# Altium footprint library connectors_socets.pcblib: 567 footprints (part 3 of 36)
Each footprint in its own frame and in the unit in brackets; x right, y up, seen from the top. Pads: shape width x height; smd on the part's side, far side on the other; paste and mask are expansions set on the pad; w line width, h text height; cw(c..) or ccw(c..) is an arc to the next point about the centre after c.
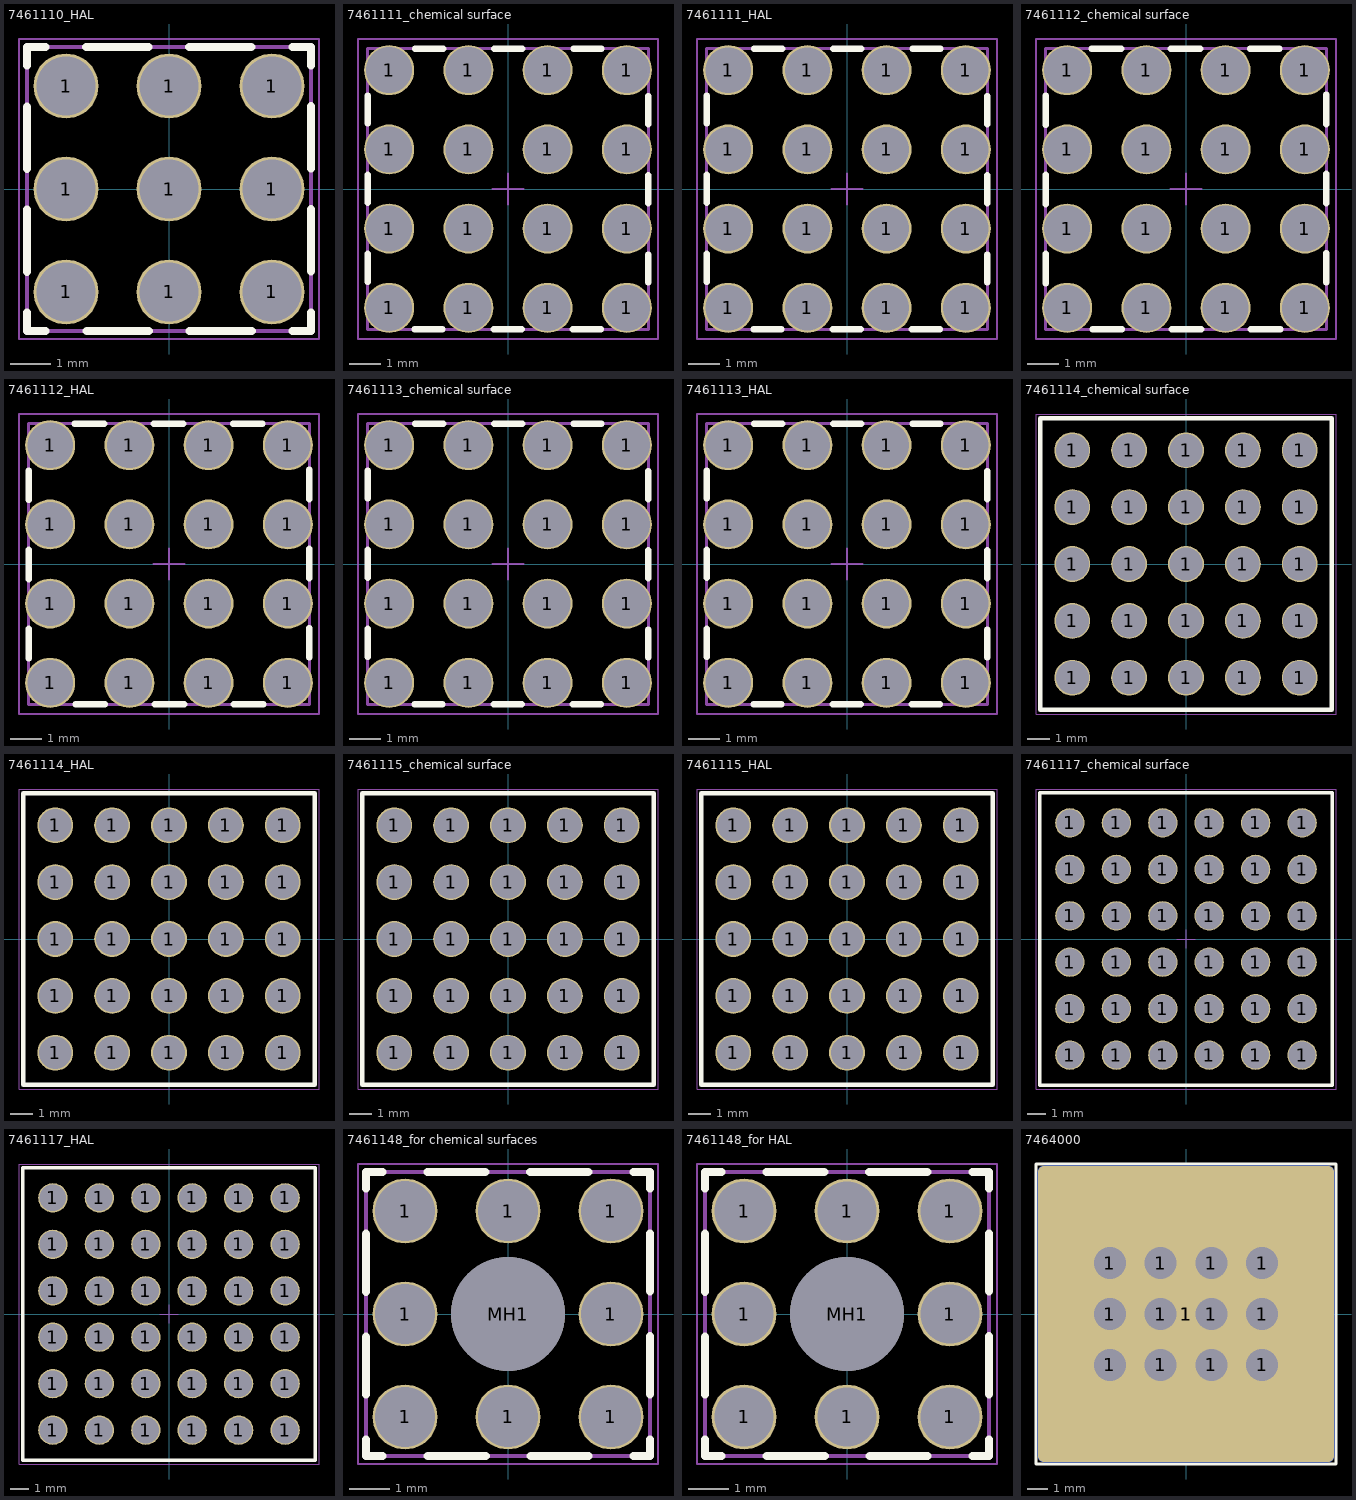
[diagram p2: the footprints below, top view; thin cyan lines are the x and y axes]

## 7461110_HAL [mm] "ID3.2mm, thrh 4mm"
height 14
pads (9):
  round 1.6 hole 1.45: 1(-2.54,-2.54) 1(-2.54,0) 1(-2.54,2.54) 1(0,-2.54) 1(0,0) 1(0,2.54) 1(2.54,-2.54) 1(2.54,0) 1(2.54,2.54)
Top Overlay:
  lines w0.2: -3.5,-3.05 -3.5,-3.5 -3.05,-3.5 ; -3.5,-2.04 -3.5,-0.51 ; -3.5,0.5 -3.5,2.03 ; -3.5,3.05 -3.5,3.5 -3.05,3.5 ; -2.04,3.5 -0.51,3.5 ; -2.03,-3.5 -0.5,-3.5 ; 0.5,3.5 2.03,3.5 ; 0.51,-3.5 2.04,-3.5 ; 3.05,-3.5 3.5,-3.5 3.5,-3.05 ; 3.05,3.5 3.5,3.5 3.5,3.05 ; 3.5,-2.03 3.5,-0.5 ; 3.5,0.51 3.5,2.04
Mechanical 11:
  lines w0.1: -3.5,-3.5 -3.5,3.5 3.5,3.5 3.5,-3.5 -3.5,-3.5
  text ".Designator" at -1.75,-0.75 h1.5
Plata3D:
  lines w0.1: -3.5,-3.5 3.5,-3.5 3.5,3.5 -3.5,3.5 -3.5,-3.5
Board3D:
  lines w0.05: -0.5,0 0.5,0 ; 0,-0.5 0,0.5 ; -3.7,-3.7 3.7,-3.7 3.7,3.7 -3.7,3.7 -3.7,-3.7
3D body "7461110.stp": height 14, standoff -3.5, extent -3.5,-3.5 3.5,3.5

## 7461111_chemical surface [mm] "M4, thr 5mm"
height 14
pads (16):
  round 1.6 hole 1.475: 1(-3.81,-3.81) 1(-3.81,-1.27) 1(-3.81,1.27) 1(-3.81,3.81) 1(-1.27,-3.81) 1(-1.27,-1.27) 1(-1.27,1.27) 1(-1.27,3.81) 1(1.27,-3.81) 1(1.27,-1.27) 1(1.27,1.27) 1(1.27,3.81) 1(3.81,-3.81) 1(3.81,-1.27) 1(3.81,1.27) 1(3.81,3.81)
Top Overlay:
  lines w0.2: -4.5,-2.98 -4.5,-2.08 ; -4.5,-0.44 -4.5,0.46 ; -4.5,2.1 -4.5,3 ; -3,-4.5 -2.1,-4.5 ; -2.98,4.5 -2.08,4.5 ; -0.46,-4.5 0.44,-4.5 ; -0.44,4.5 0.46,4.5 ; 2.08,-4.5 2.98,-4.5 ; 2.1,4.5 3,4.5 ; 4.5,-3 4.5,-2.1 ; 4.5,-0.46 4.5,0.44 ; 4.5,2.08 4.5,2.98
Mechanical 11:
  lines w0.1: -4.5,-4.5 -4.5,4.5 4.5,4.5 4.5,-4.5 -4.5,-4.5
  text ".Designator" at -1.75,-0.75 h1.5
Plata3D:
  lines w0.1: -4.5,-4.5 4.5,-4.5 4.5,4.5 -4.5,4.5 -4.5,-4.5
Board3D:
  lines w0.05: -0.5,0 0.5,0 ; 0,-0.5 0,0.5 ; -4.81,-4.81 4.81,-4.81 4.81,4.81 -4.81,4.81 -4.81,-4.81
3D body "7461111.stp": height 14, standoff -3.5, extent -4.5,-4.5 4.5,4.5

## 7461111_HAL [mm] "M4, thr 5mm"
height 14
pads (16):
  round 1.6 hole 1.45: 1(-3.81,-3.81) 1(-3.81,-1.27) 1(-3.81,1.27) 1(-3.81,3.81) 1(-1.27,-3.81) 1(-1.27,-1.27) 1(-1.27,1.27) 1(-1.27,3.81) 1(1.27,-3.81) 1(1.27,-1.27) 1(1.27,1.27) 1(1.27,3.81) 1(3.81,-3.81) 1(3.81,-1.27) 1(3.81,1.27) 1(3.81,3.81)
Top Overlay:
  lines w0.2: -4.5,-2.98 -4.5,-2.08 ; -4.5,-0.44 -4.5,0.46 ; -4.5,2.1 -4.5,3 ; -3,-4.5 -2.1,-4.5 ; -2.98,4.5 -2.08,4.5 ; -0.46,-4.5 0.44,-4.5 ; -0.44,4.5 0.46,4.5 ; 2.08,-4.5 2.98,-4.5 ; 2.1,4.5 3,4.5 ; 4.5,-3 4.5,-2.1 ; 4.5,-0.46 4.5,0.44 ; 4.5,2.08 4.5,2.98
Mechanical 11:
  lines w0.1: -4.5,-4.5 -4.5,4.5 4.5,4.5 4.5,-4.5 -4.5,-4.5
  text ".Designator" at -1.75,-0.75 h1.5
Plata3D:
  lines w0.1: -4.5,-4.5 -4.5,4.5 4.5,4.5 4.5,-4.5 -4.5,-4.5
Board3D:
  lines w0.05: -0.5,0 0.5,0 ; 0,-0.5 0,0.5 ; -4.81,-4.81 4.81,-4.81 4.81,4.81 -4.81,4.81 -4.81,-4.81
3D body "7461111.stp": height 14, standoff -3.5, extent -4.5,-4.5 4.5,4.5

## 7461112_chemical surface [mm] "M5, thr 5mm"
height 14
pads (16):
  round 1.6 hole 1.475: 1(-3.81,-3.81) 1(-3.81,-1.27) 1(-3.81,1.27) 1(-3.81,3.81) 1(-1.27,-3.81) 1(-1.27,-1.27) 1(-1.27,1.27) 1(-1.27,3.81) 1(1.27,-3.81) 1(1.27,-1.27) 1(1.27,1.27) 1(1.27,3.81) 1(3.81,-3.81) 1(3.81,-1.27) 1(3.81,1.27) 1(3.81,3.81)
Top Overlay:
  lines w0.2: -4.5,-3.03 -4.5,-2.08 ; -4.5,-0.49 -4.5,0.46 ; -4.5,2.05 -4.5,3 ; -3.03,4.5 -2.08,4.5 ; -3,-4.5 -2.05,-4.5 ; -0.49,4.5 0.46,4.5 ; -0.46,-4.5 0.49,-4.5 ; 2.05,4.5 3,4.5 ; 2.08,-4.5 3.03,-4.5 ; 4.5,-3 4.5,-2.05 ; 4.5,-0.46 4.5,0.49 ; 4.5,2.08 4.5,3.03
Mechanical 11:
  lines w0.1: -4.5,-4.5 4.5,-4.5 4.5,4.5 -4.5,4.5 -4.5,-4.5
  text ".Designator" at -1.75,-0.75 h1.5
Plata3D:
  lines w0.1: -4.5,-4.5 -4.5,4.5 4.5,4.5 4.5,-4.5 -4.5,-4.5
Board3D:
  lines w0.05: -0.5,0 0.5,0 ; 0,-0.5 0,0.5 ; -4.81,-4.81 4.81,-4.81 4.81,4.81 -4.81,4.81 -4.81,-4.81
3D body "7461112.stp": height 14, standoff -3.5, extent -4.5,-4.5 4.5,4.5

## 7461112_HAL [mm] "M5, thr 5mm"
height 14
pads (16):
  round 1.6 hole 1.45: 1(-3.81,-3.81) 1(-3.81,-1.27) 1(-3.81,1.27) 1(-3.81,3.81) 1(-1.27,-3.81) 1(-1.27,-1.27) 1(-1.27,1.27) 1(-1.27,3.81) 1(1.27,-3.81) 1(1.27,-1.27) 1(1.27,1.27) 1(1.27,3.81) 1(3.81,-3.81) 1(3.81,-1.27) 1(3.81,1.27) 1(3.81,3.81)
Top Overlay:
  lines w0.2: -4.5,-3.03 -4.5,-2.08 ; -4.5,-0.49 -4.5,0.46 ; -4.5,2.05 -4.5,3 ; -3.03,4.5 -2.08,4.5 ; -3,-4.5 -2.05,-4.5 ; -0.49,4.5 0.46,4.5 ; -0.46,-4.5 0.49,-4.5 ; 2.05,4.5 3,4.5 ; 2.08,-4.5 3.03,-4.5 ; 4.5,-3 4.5,-2.05 ; 4.5,-0.46 4.5,0.49 ; 4.5,2.08 4.5,3.03
Mechanical 11:
  lines w0.1: -4.5,-4.5 -4.5,4.5 4.5,4.5 4.5,-4.5 -4.5,-4.5
  text ".Designator" at -1.75,-0.75 h1.5
Plata3D:
  lines w0.1: -4.5,-4.5 -4.5,4.5 4.5,4.5 4.5,-4.5 -4.5,-4.5
Board3D:
  lines w0.05: -0.5,0 0.5,0 ; 0,-0.5 0,0.5 ; -4.81,-4.81 -4.81,4.81 4.81,4.81 4.81,-4.81 -4.81,-4.81
3D body "7461112.stp": height 14, standoff -3.5, extent -4.5,-4.5 4.5,4.5

## 7461113_chemical surface [mm] "ID5.2mm, thrh 5mm"
height 14
pads (16):
  round 1.6 hole 1.475: 1(-3.81,-3.81) 1(-3.81,-1.27) 1(-3.81,1.27) 1(-3.81,3.81) 1(-1.27,-3.81) 1(-1.27,-1.27) 1(-1.27,1.27) 1(-1.27,3.81) 1(1.27,-3.81) 1(1.27,-1.27) 1(1.27,1.27) 1(1.27,3.81) 1(3.81,-3.81) 1(3.81,-1.27) 1(3.81,1.27) 1(3.81,3.81)
Top Overlay:
  lines w0.2: -4.5,-2.98 -4.5,-2.08 ; -4.5,-0.44 -4.5,0.46 ; -4.5,2.1 -4.5,3 ; -3,-4.5 -2.1,-4.5 ; -2.98,4.5 -2.08,4.5 ; -0.46,-4.5 0.44,-4.5 ; -0.44,4.5 0.46,4.5 ; 2.08,-4.5 2.98,-4.5 ; 2.1,4.5 3,4.5 ; 4.5,-3 4.5,-2.1 ; 4.5,-0.46 4.5,0.44 ; 4.5,2.08 4.5,2.98
Mechanical 11:
  lines w0.1: -4.5,-4.5 -4.5,4.5 4.5,4.5 4.5,-4.5 -4.5,-4.5
  text ".Designator" at -1.75,-0.75 h1.5
Plata3D:
  lines w0.1: -4.5,-4.5 4.5,-4.5 4.5,4.5 -4.5,4.5 -4.5,-4.5
Board3D:
  lines w0.05: -0.5,0 0.5,0 ; 0,-0.5 0,0.5 ; -4.81,-4.81 -4.81,4.81 4.81,4.81 4.81,-4.81 -4.81,-4.81
3D body "7461113.stp": height 14, standoff -3.5, extent -4.5,-4.5 4.5,4.5

## 7461113_HAL [mm] "ID5.2mm, thrh 5mm"
height 14
pads (16):
  round 1.6 hole 1.45: 1(-3.81,-3.81) 1(-3.81,-1.27) 1(-3.81,1.27) 1(-3.81,3.81) 1(-1.27,-3.81) 1(-1.27,-1.27) 1(-1.27,1.27) 1(-1.27,3.81) 1(1.27,-3.81) 1(1.27,-1.27) 1(1.27,1.27) 1(1.27,3.81) 1(3.81,-3.81) 1(3.81,-1.27) 1(3.81,1.27) 1(3.81,3.81)
Top Overlay:
  lines w0.2: -4.5,-2.98 -4.5,-2.08 ; -4.5,-0.44 -4.5,0.46 ; -4.5,2.1 -4.5,3 ; -3,-4.5 -2.1,-4.5 ; -2.98,4.5 -2.08,4.5 ; -0.46,-4.5 0.44,-4.5 ; -0.44,4.5 0.46,4.5 ; 2.08,-4.5 2.98,-4.5 ; 2.1,4.5 3,4.5 ; 4.5,-3 4.5,-2.1 ; 4.5,-0.46 4.5,0.44 ; 4.5,2.08 4.5,2.98
Mechanical 11:
  lines w0.1: -4.5,-4.5 -4.5,4.5 4.5,4.5 4.5,-4.5 -4.5,-4.5
  text ".Designator" at -1.75,-0.75 h1.5
Plata3D:
  lines w0.1: -4.5,-4.5 4.5,-4.5 4.5,4.5 -4.5,4.5 -4.5,-4.5
Board3D:
  lines w0.05: -0.5,0 0.5,0 ; 0,-0.5 0,0.5 ; -4.81,-4.81 4.81,-4.81 4.81,4.81 -4.81,4.81 -4.81,-4.81
3D body "7461113.stp": height 14, standoff -3.5, extent -4.5,-4.5 4.5,4.5

## 7461114_chemical surface [mm] "M6, thr 8mm"
height 20
pads (25):
  round 1.6 hole 1.475: 1(-5.08,-5.08) 1(-5.08,-2.54) 1(-5.08,0) 1(-5.08,2.54) 1(-5.08,5.08) 1(-2.54,-5.08) 1(-2.54,-2.54) 1(-2.54,0) 1(-2.54,2.54) 1(-2.54,5.08) 1(0,-5.08) 1(0,-2.54) 1(0,0) 1(0,2.54) 1(0,5.08) 1(2.54,-5.08) 1(2.54,-2.54) 1(2.54,0) 1(2.54,2.54) 1(2.54,5.08) 1(5.08,-5.08) 1(5.08,-2.54) 1(5.08,0) 1(5.08,2.54) 1(5.08,5.08)
Top Overlay:
  lines w0.2: -6.5,-6.5 -6.5,6.5 6.5,6.5 6.5,-6.5 -6.5,-6.5
Mechanical 11:
  lines w0.1: -6.5,-6.5 6.5,-6.5 6.5,6.5 -6.5,6.5 -6.5,-6.5
  text ".Designator" at -1.75,-0.75 h1.5
Plata3D:
  lines w0.1: -6.5,-6.5 -6.5,6.5 6.5,6.5 6.5,-6.5 -6.5,-6.5
Board3D:
  lines w0.05: -0.5,0 0.5,0 ; 0,-0.5 0,0.5 ; -6.7,-6.7 -6.7,6.7 6.7,6.7 6.7,-6.7 -6.7,-6.7
3D body "7461114.stp": height 20, standoff -3.5, extent -6.5,-6.5 6.5,6.5

## 7461114_HAL [mm] "M6, thr 8mm"
height 20
pads (25):
  round 1.6 hole 1.45: 1(-5.08,-5.08) 1(-5.08,-2.54) 1(-5.08,0) 1(-5.08,2.54) 1(-5.08,5.08) 1(-2.54,-5.08) 1(-2.54,-2.54) 1(-2.54,0) 1(-2.54,2.54) 1(-2.54,5.08) 1(0,-5.08) 1(0,-2.54) 1(0,0) 1(0,2.54) 1(0,5.08) 1(2.54,-5.08) 1(2.54,-2.54) 1(2.54,0) 1(2.54,2.54) 1(2.54,5.08) 1(5.08,-5.08) 1(5.08,-2.54) 1(5.08,0) 1(5.08,2.54) 1(5.08,5.08)
Top Overlay:
  lines w0.2: -6.5,-6.5 6.5,-6.5 6.5,6.5 -6.5,6.5 -6.5,-6.5
Mechanical 11:
  lines w0.1: -6.5,-6.5 -6.5,6.5 6.5,6.5 6.5,-6.5 -6.5,-6.5
  text ".Designator" at -1.75,-0.75 h1.5
Plata3D:
  lines w0.1: -6.5,-6.5 -6.5,6.5 6.5,6.5 6.5,-6.5 -6.5,-6.5
Board3D:
  lines w0.05: -0.5,0 0.5,0 ; 0,-0.5 0,0.5 ; -6.7,-6.7 6.7,-6.7 6.7,6.7 -6.7,6.7 -6.7,-6.7
3D body "7461114.stp": height 20, standoff -3.5, extent -6.5,-6.5 6.5,6.5

## 7461115_chemical surface [mm] "ID6.2mm, thrh 8mm"
height 20
pads (25):
  round 1.6 hole 1.475: 1(-5.08,-5.08) 1(-5.08,-2.54) 1(-5.08,0) 1(-5.08,2.54) 1(-5.08,5.08) 1(-2.54,-5.08) 1(-2.54,-2.54) 1(-2.54,0) 1(-2.54,2.54) 1(-2.54,5.08) 1(0,-5.08) 1(0,-2.54) 1(0,0) 1(0,2.54) 1(0,5.08) 1(2.54,-5.08) 1(2.54,-2.54) 1(2.54,0) 1(2.54,2.54) 1(2.54,5.08) 1(5.08,-5.08) 1(5.08,-2.54) 1(5.08,0) 1(5.08,2.54) 1(5.08,5.08)
Top Overlay:
  lines w0.2: -6.5,-6.5 -6.5,6.5 6.5,6.5 6.5,-6.5 -6.5,-6.5
Mechanical 11:
  lines w0.1: -6.5,-6.5 6.5,-6.5 6.5,6.5 -6.5,6.5 -6.5,-6.5
  text ".Designator" at -1.75,-0.75 h1.5
Plata3D:
  lines w0.1: -6.5,-6.5 -6.5,6.5 6.5,6.5 6.5,-6.5 -6.5,-6.5
Board3D:
  lines w0.05: -0.5,0 0.5,0 ; 0,-0.5 0,0.5 ; -6.7,-6.7 6.7,-6.7 6.7,6.7 -6.7,6.7 -6.7,-6.7
3D body "7461115.stp": height 20, standoff -3.5, extent -6.5,-6.5 6.5,6.5

## 7461115_HAL [mm] "ID6.2mm, thrh 8mm"
height 20
pads (25):
  round 1.6 hole 1.45: 1(-5.08,-5.08) 1(-5.08,-2.54) 1(-5.08,0) 1(-5.08,2.54) 1(-5.08,5.08) 1(-2.54,-5.08) 1(-2.54,-2.54) 1(-2.54,0) 1(-2.54,2.54) 1(-2.54,5.08) 1(0,-5.08) 1(0,-2.54) 1(0,0) 1(0,2.54) 1(0,5.08) 1(2.54,-5.08) 1(2.54,-2.54) 1(2.54,0) 1(2.54,2.54) 1(2.54,5.08) 1(5.08,-5.08) 1(5.08,-2.54) 1(5.08,0) 1(5.08,2.54) 1(5.08,5.08)
Top Overlay:
  lines w0.2: -6.5,-6.5 6.5,-6.5 6.5,6.5 -6.5,6.5 -6.5,-6.5
Mechanical 11:
  lines w0.1: -6.5,-6.5 -6.5,6.5 6.5,6.5 6.5,-6.5 -6.5,-6.5
  text ".Designator" at -1.75,-0.75 h1.5
Plata3D:
  lines w0.1: -6.5,-6.5 -6.5,6.5 6.5,6.5 6.5,-6.5 -6.5,-6.5
Board3D:
  lines w0.05: -0.5,0 0.5,0 ; 0,-0.5 0,0.5 ; -6.7,-6.7 -6.7,6.7 6.7,6.7 6.7,-6.7 -6.7,-6.7
3D body "7461115.stp": height 20, standoff -3.5, extent -6.5,-6.5 6.5,6.5

## 7461117_chemical surface [mm] "M10, thr 10mm"
height 25
pads (36):
  round 1.6 hole 1.475: 1(-6.35,-6.35) 1(-6.35,-3.81) 1(-6.35,-1.27) 1(-6.35,1.27) 1(-6.35,3.81) 1(-6.35,6.35) 1(-3.81,-6.35) 1(-3.81,-3.81) 1(-3.81,-1.27) 1(-3.81,1.27) 1(-3.81,3.81) 1(-3.81,6.35) 1(-1.27,-6.35) 1(-1.27,-3.81) 1(-1.27,-1.27) 1(-1.27,1.27) 1(-1.27,3.81) 1(-1.27,6.35) 1(1.27,-6.35) 1(1.27,-3.81) 1(1.27,-1.27) 1(1.27,1.27) 1(1.27,3.81) 1(1.27,6.35) 1(3.81,-6.35) 1(3.81,-3.81) 1(3.81,-1.27) 1(3.81,1.27) 1(3.81,3.81) 1(3.81,6.35) 1(6.35,-6.35) 1(6.35,-3.81) 1(6.35,-1.27) 1(6.35,1.27) 1(6.35,3.81) 1(6.35,6.35)
Top Overlay:
  lines w0.2: -8,-8 -8,8 8,8 8,-8 -8,-8
Mechanical 11:
  lines w0.1: -8,-8 8,-8 8,8 -8,8 -8,-8
  text ".Designator" at -1.75,-0.75 h1.5
Plata3D:
  lines w0.1: -8,-8 -8,8 8,8 8,-8 -8,-8
Board3D:
  lines w0.05: -0.5,0 0.5,0 ; 0,-0.5 0,0.5 ; -8.2,-8.2 -8.2,8.2 8.2,8.2 8.2,-8.2 -8.2,-8.2
3D body "7461117.stp": height 25, standoff -3.5, extent -8,-8 8,8

## 7461117_HAL [mm] "M10, thr 10mm"
height 25
pads (36):
  round 1.6 hole 1.45: 1(-6.35,-6.35) 1(-6.35,-3.81) 1(-6.35,-1.27) 1(-6.35,1.27) 1(-6.35,3.81) 1(-6.35,6.35) 1(-3.81,-6.35) 1(-3.81,-3.81) 1(-3.81,-1.27) 1(-3.81,1.27) 1(-3.81,3.81) 1(-3.81,6.35) 1(-1.27,-6.35) 1(-1.27,-3.81) 1(-1.27,-1.27) 1(-1.27,1.27) 1(-1.27,3.81) 1(-1.27,6.35) 1(1.27,-6.35) 1(1.27,-3.81) 1(1.27,-1.27) 1(1.27,1.27) 1(1.27,3.81) 1(1.27,6.35) 1(3.81,-6.35) 1(3.81,-3.81) 1(3.81,-1.27) 1(3.81,1.27) 1(3.81,3.81) 1(3.81,6.35) 1(6.35,-6.35) 1(6.35,-3.81) 1(6.35,-1.27) 1(6.35,1.27) 1(6.35,3.81) 1(6.35,6.35)
Top Overlay:
  lines w0.2: -8,-8 8,-8 8,8 -8,8 -8,-8
Mechanical 11:
  lines w0.1: -8,-8 -8,8 8,8 8,-8 -8,-8
  text ".Designator" at -1.75,-0.75 h1.5
Plata3D:
  lines w0.1: -8,-8 -8,8 8,8 8,-8 -8,-8
Board3D:
  lines w0.05: -0.5,0 0.5,0 ; 0,-0.5 0,0.5 ; -8.2,-8.2 8.2,-8.2 8.2,8.2 -8.2,8.2 -8.2,-8.2
3D body "7461117.stp": height 25, standoff -3.5, extent -8,-8 8,8

## 7461148_for chemical surfaces [mm] "M2.5, thr 6mm"
height 6
pads (9):
  round 1.6 hole 1.475: 1(-2.54,-2.54) 1(-2.54,0) 1(-2.54,2.54) 1(0,-2.54) 1(0,2.54) 1(2.54,-2.54) 1(2.54,0) 1(2.54,2.54)
  round 2.8 hole 2.8 unplated: MH1(0,0)
Top Overlay:
  lines w0.2: -3.5,-3.1 -3.5,-3.5 -3.1,-3.5 ; -3.5,-1.99 -3.5,-0.56 ; -3.5,0.55 -3.5,1.98 ; -3.5,3.1 -3.5,3.5 -3.1,3.5 ; -1.99,3.5 -0.56,3.5 ; -1.98,-3.5 -0.55,-3.5 ; 0.55,3.5 1.98,3.5 ; 0.56,-3.5 1.99,-3.5 ; 3.1,-3.5 3.5,-3.5 3.5,-3.1 ; 3.1,3.5 3.5,3.5 3.5,3.1 ; 3.5,-1.98 3.5,-0.55 ; 3.5,0.56 3.5,1.99
Plata3D:
  lines w0.1: -3.5,-3.5 -3.5,3.5 3.5,3.5 3.5,-3.5 -3.5,-3.5
Board3D:
  lines w0.05: -0.5,0 0.5,0 ; 0,-0.5 0,0.5 ; -3.7,-3.7 3.7,-3.7 3.7,3.7 -3.7,3.7 -3.7,-3.7
3D body "7461148.stp": height 6, standoff -3.5, extent -3.5,-3.5 3.5,3.5

## 7461148_for HAL [mm] "M2.5, thr 6mm"
height 6
pads (9):
  round 1.6 hole 1.45: 1(-2.54,-2.54) 1(-2.54,0) 1(-2.54,2.54) 1(0,-2.54) 1(0,2.54) 1(2.54,-2.54) 1(2.54,0) 1(2.54,2.54)
  round 2.8 hole 2.8 unplated: MH1(0,0)
Top Overlay:
  lines w0.2: -3.5,-3.1 -3.5,-3.5 -3.1,-3.5 ; -3.5,-1.99 -3.5,-0.56 ; -3.5,0.55 -3.5,1.98 ; -3.5,3.1 -3.5,3.5 -3.1,3.5 ; -1.99,3.5 -0.56,3.5 ; -1.98,-3.5 -0.55,-3.5 ; 0.55,3.5 1.98,3.5 ; 0.56,-3.5 1.99,-3.5 ; 3.1,-3.5 3.5,-3.5 3.5,-3.1 ; 3.1,3.5 3.5,3.5 3.5,3.1 ; 3.5,-1.98 3.5,-0.55 ; 3.5,0.56 3.5,1.99
Plata3D:
  lines w0.1: -3.5,-3.5 -3.5,3.5 3.5,3.5 3.5,-3.5 -3.5,-3.5
Board3D:
  lines w0.05: -0.5,0 0.5,0 ; 0,-0.5 0,0.5 ; -3.7,-3.7 3.7,-3.7 3.7,3.7 -3.7,3.7 -3.7,-3.7
3D body "7461148.stp": height 6, standoff -3.5, extent -3.5,-3.5 3.5,3.5

## 7464000 [mm]
pads (14):
  round 2 hole 1.6 mask+0.05: 1(-3.81,-2.54) 1(-3.81,0) 1(-3.81,2.54) 1(-1.27,-2.54) 1(-1.27,0) 1(-1.27,2.54) 1(1.27,-2.54) 1(1.27,0) 1(1.27,2.54) 1(3.81,-2.54) 1(3.81,0) 1(3.81,2.54)
  rrect4% 14.8x14.8 smd mask-2.3: 1(0,0)
  rrect4% 14.8x14.8 smd far side mask+0.05: 1(0,0)
Top Overlay:
  lines w0.15: -7.5,-7.5 7.5,-7.5 7.5,7.5 -7.5,7.5 -7.5,-7.5
3D body "7464000 (rev1).stp": height 18.1, standoff -3.5, extent -7.385,-7.385 7.385,7.385